# Altium schematic symbol library lib_datalogger.SchLib: 1246 symbols (part 10 of 16)
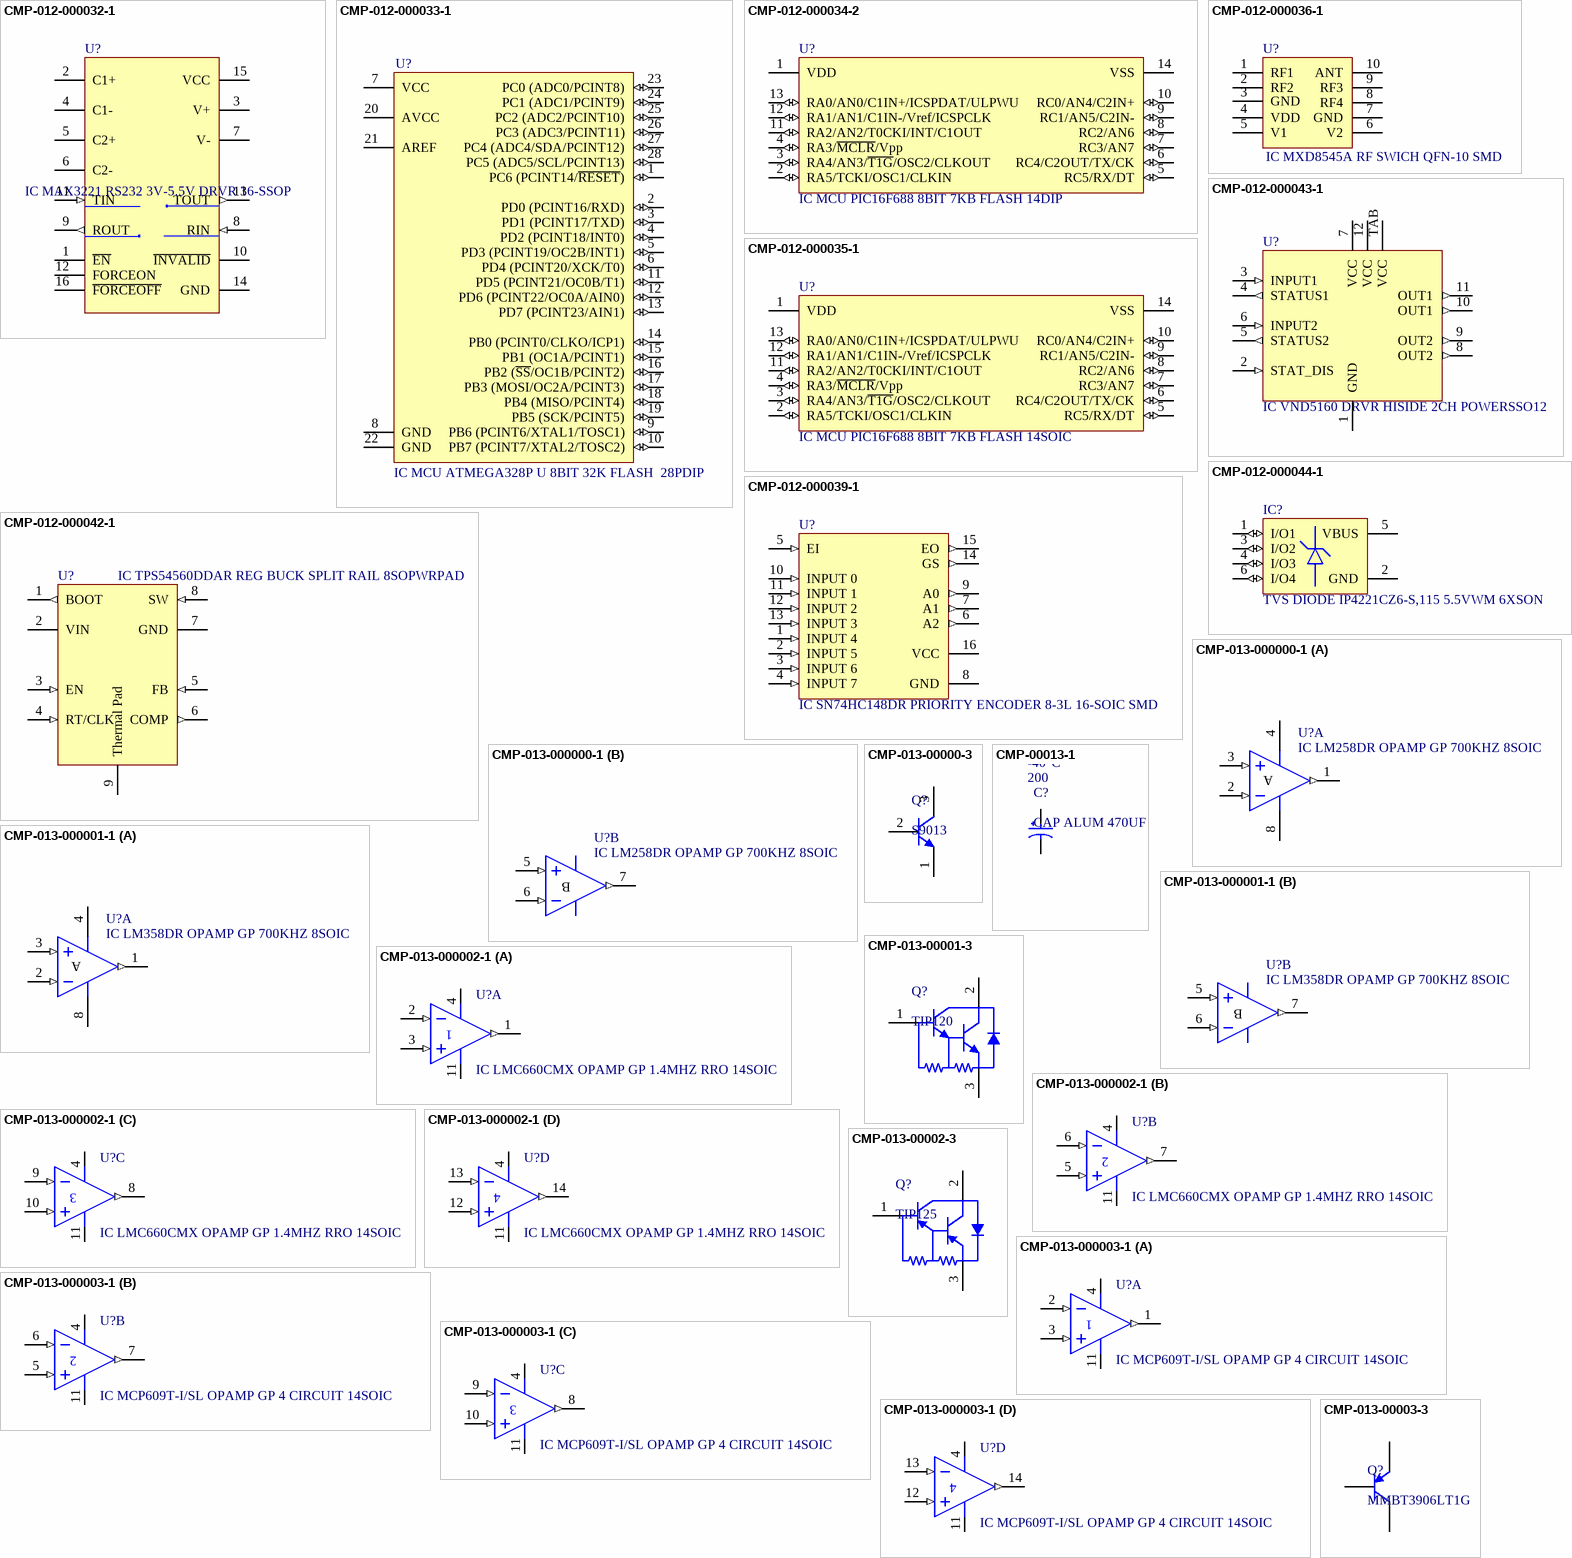
[diagram p52: symbols CMP-012-000032-1 to CMP-013-00003-3]

## CMP-012-000034-2
designator U?, comment IC MCU PIC16F688 8BIT 7KB FLASH 14DIP
IC MCU 8BIT 7KB FLASH 14DIP; Manufacturer Part Number: PIC16F688-I/P; Manufacturer: Microchip; Number of Bits: 8; Number of I2C Channels: 1; Max Frequency: 20MHz; Number of Programmable I/O: 12; Number of PWM Channels: 0; RAM Size: 256B; Address Bus Width: 8b; Number of Timers/Counters: 2; Access Time: 20us; Max Supply Voltage: 5.5V; Max Power Dissipation: 800mW; Min Supply Voltage: 2V; Peripherals: PWM,Brown-out Detect/Reset,POR,WDT; Core Architecture: PIC; Oscillator Type: Internal; Interface: UART,USART,SCI; Nominal Supply Current: 3.1mA; Watchdog Timer: Yes; Density: 7KB; ComponentLink1URL: https://datasheet.ciiva.com/16287/41203e-16287126.pdf?src-supplier=Future+Electronics; Stock 1: 533; Radiation Hardening: No; Lead Free: Lead Free; ComponentLink1Description: https://datasheet.ciiva.com/16287/41203e-16287126.pdf?src-supplier=Future+Electronics; REACH SVHC: No SVHC; Source: mits.SchLib; ComponentLink6URL: https://datasheet.ciiva.com/22671/1572921-22671231.pdf?src-supplier=Element14; Frequency: 20MHz; ComponentLink6Description: https://datasheet.ciiva.com/22671/1572921-22671231.pdf?src-supplier=Element14; Case/Package: PDIP; Memory Type: FLASH; Package Quantity: 30; ComponentLink4URL: https://datasheet.ciiva.com/7892/41203e-7892446.pdf?src-supplier=Element14; Min Operating Temperature: -40°C; Number of Pins: 14; Memory Size: 7KB; RoHS: Yes; Number of ADC Channels: 8; ComponentLink3Description: https://datasheet.ciiva.com/14132/asmicrochip-cont-pic16f6-en-14132075.pdf?src-supplier=Distrelec; Number of I/Os: 12; ComponentLink3URL: https://datasheet.ciiva.com/14132/asmicrochip-cont-pic16f6-en-14132075.pdf?src-supplier=Distrelec; Number of SPI Channels: 1; Design Item ID: IC MCU PIC16F688 8BIT 7KB FLASH 14DIP; ComponentLink5Description: https://datasheet.ciiva.com/22671/1572921-22671230.pdf?src-supplier=Element14; Packaging: Rail/Tube; Height: 0.195inch; Mount: Through Hole; Number of A/D Converters: 1; ComponentLink4Description: https://datasheet.ciiva.com/7892/41203e-7892446.pdf?src-supplier=Element14; Number of UART Channels: 1; ComponentLink2Description: https://datasheet.ciiva.com/1487/41203e-1487963.pdf?src-supplier=Digi-Key; Width: 0.28inch; ComponentLink2URL: https://datasheet.ciiva.com/1487/41203e-1487963.pdf?src-supplier=Digi-Key; Category: Microcontrollers; Max Operating Temperature: 85°C; Length: 19.69mm; Data Bus Width: 8b; ComponentLink5URL: https://datasheet.ciiva.com/22671/1572921-22671230.pdf?src-supplier=Element14; Pricing 1: 1=1,66000 (USD)
footprint 14-SOIC
footprint 14-PDIP (DIP; 16 Leads; Row Spacing 7.62 mm; Pitch 2.54 mm)
pins: 1 VDD (power) "Power Supply, 3.3V", 2 RA5/TCKI/OSC1/CLKIN (io), 3 RA4/AN3/~{T1G}/OSC2/CLKOUT (io), 4 RA3/~{MCLR}/Vpp (io), 5 RC5/RX/DT (io), 6 RC4/C2OUT/TX/CK (io), 7 RC3/AN7 (io), 8 RC2/AN6 (io), 9 RC1/AN5/C2IN- (io), 10 RC0/AN4/C2IN+ (io), 11 RA2/AN2/T0CKI/INT/C1OUT (io), 12 RA1/AN1/C1IN-/Vref/ICSPCLK (io), 13 RA0/AN0/C1IN+/ICSPDAT/ULPWU (io), 14 VSS (power) "GND"

## CMP-012-000035-1
designator U?, comment IC MCU PIC16F688 8BIT 7KB FLASH 14SOIC
8-bit Microcontrollers - MCU 7KB 256 RAM 12 I/O; Manufacturer: Microchip; Manufacturer Part Number: PIC16F688T-I/SL; Interface: UART,USART,SCI; Watchdog Timer: Yes; Number of I/Os: 12; Max Supply Voltage: 5.5V; Frequency: 20MHz; Number of ADC Channels: 8; Access Time: 20us; Nominal Supply Current: 220uA; Number of Timers/Counters: 2; Peripherals: Brown-out Detect/Reset,POR,WDT; Oscillator Type: Internal; Min Supply Voltage: 2V; RAM Size: 256B; Max Power Dissipation: 800mW; Core Architecture: PIC; Data Bus Width: 8b; ComponentLink6URL: https://datasheet.ciiva.com/22671/1572921-22671231.pdf?src-supplier=Element14; ComponentLink14Description: https://datasheet.ciiva.com/16396/41203e-16396367.pdf?src-supplier=Future+Electronics; ComponentLink6Description: https://datasheet.ciiva.com/22671/1572921-22671231.pdf?src-supplier=Element14; ComponentLink10URL: https://datasheet.ciiva.com/46382/1572921-46382664.pdf?src-supplier=Element14; ComponentLink9URL: https://datasheet.ciiva.com/9238/41203e-9238520.pdf?src-supplier=Avnet; Max Operating Temperature: 85°C; ComponentLink14URL: https://datasheet.ciiva.com/16396/41203e-16396367.pdf?src-supplier=Future+Electronics; Min Operating Temperature: -40°C; ComponentLink8URL: https://datasheet.ciiva.com/17384/41203e-17384135.pdf?src-supplier=Avnet+Europe; Memory Type: FLASH; ComponentLink11Description: https://datasheet.ciiva.com/6639/41203e-6639801.pdf?src-supplier=Digi-Key; Mount: Surface Mount; ComponentLink13Description: https://datasheet.ciiva.com/7892/1572921-7892447.pdf?src-supplier=Element14; Lead Free: Lead Free; Source: mits.SchLib; Design Item ID: IC MCU PIC16F688 8BIT 7KB FLASH 14SOIC; Memory Size: 7KB; ComponentLink1Description: https://datasheet.ciiva.com/16287/41203e-16287126.pdf?src-supplier=Future+Electronics; ComponentLink5Description: https://datasheet.ciiva.com/22671/1572921-22671230.pdf?src-supplier=Element14; Pricing 1: 1=1,61000 (USD); Number of Pins: 14; REACH SVHC: No SVHC; ComponentLink11URL: https://datasheet.ciiva.com/6639/41203e-6639801.pdf?src-supplier=Digi-Key; Packaging: Tape and Reel; Category: Microprocessors; RoHS: Yes; ComponentLink7Description: https://datasheet.ciiva.com/22671/1572921-22671232.pdf?src-supplier=Element14; ComponentLink4Description: https://datasheet.ciiva.com/7892/41203e-7892446.pdf?src-supplier=Element14; ComponentLink9Description: https://datasheet.ciiva.com/9238/41203e-9238520.pdf?src-supplier=Avnet; ComponentLink3URL: https://datasheet.ciiva.com/14132/asmicrochip-cont-pic16f6-en-14132075.pdf?src-supplier=Distrelec; ComponentLink12Description: https://datasheet.ciiva.com/14132/pic16f688-eng-tds-14132333.pdf?src-supplier=Distrelec; Max Frequency: 20MHz; Stock 1: 1701; ComponentLink1URL: https://datasheet.ciiva.com/16287/41203e-16287126.pdf?src-supplier=Future+Electronics; ComponentLink7URL: https://datasheet.ciiva.com/22671/1572921-22671232.pdf?src-supplier=Element14; ComponentLink13URL: https://datasheet.ciiva.com/7892/1572921-7892447.pdf?src-supplier=Element14; ComponentLink2Description: https://datasheet.ciiva.com/1487/41203e-1487963.pdf?src-supplier=Digi-Key; ComponentLink4URL: https://datasheet.ciiva.com/7892/41203e-7892446.pdf?src-supplier=Element14; Radiation Hardening: No; Case/Package: SOIC; Package Quantity: 2600; ComponentLink3Description: https://datasheet.ciiva.com/14132/asmicrochip-cont-pic16f6-en-14132075.pdf?src-supplier=Distrelec; Number of Programmable I/O: 12; Address Bus Width: 8b; ComponentLink12URL: https://datasheet.ciiva.com/14132/pic16f688-eng-tds-14132333.pdf?src-supplier=Distrelec; ComponentLink2URL: https://datasheet.ciiva.com/1487/41203e-1487963.pdf?src-supplier=Digi-Key; ComponentLink5URL: https://datasheet.ciiva.com/22671/1572921-22671230.pdf?src-supplier=Element14; ComponentLink8Description: https://datasheet.ciiva.com/17384/41203e-17384135.pdf?src-supplier=Avnet+Europe; ComponentLink10Description: https://datasheet.ciiva.com/46382/1572921-46382664.pdf?src-supplier=Element14
footprint 14-SOIC
footprint 14-SOIC
pins: 1 VDD (power) "Power Supply, 3.3V", 2 RA5/TCKI/OSC1/CLKIN (io), 3 RA4/AN3/~{T1G}/OSC2/CLKOUT (io), 4 RA3/~{MCLR}/Vpp (io), 5 RC5/RX/DT (io), 6 RC4/C2OUT/TX/CK (io), 7 RC3/AN7 (io), 8 RC2/AN6 (io), 9 RC1/AN5/C2IN- (io), 10 RC0/AN4/C2IN+ (io), 11 RA2/AN2/T0CKI/INT/C1OUT (io), 12 RA1/AN1/C1IN-/Vref/ICSPCLK (io), 13 RA0/AN0/C1IN+/ICSPDAT/ULPWU (io), 14 VSS (power) "GND"

## CMP-012-000036-1
designator U?, comment IC MXD8545A RF SWICH QFN-10 SMD
Manufacturer: Maxscend; Source: mits.SchLib; Supplier Unit Price 1: 0.2556; Design Item ID: IC MXD8545A RF SWICH QFN-10 SMD; ComponentLink1Description: Maxscend-MXD8545A_C285577.pdf; Manufacturer Part Number: MXD8545A; ComponentLink1URL: Maxscend-MXD8545A_C285577.pdf
footprint QFN-10
footprint QFN-10
pins: 1 RF1 "parallel data output", 2 RF2 "parallel data output", 3 GND (power) "parallel data output", 4 VDD (power) "parallel data output", 5 V1 "parallel data output", 6 V2 "parallel data output", 7 GND (power) "parallel data output", 8 RF4 (power) "ground (0 V)", 9 RF3 "serial data output", 10 ANT "master reset (active LOW)"

## CMP-012-000039-1
designator U?, comment IC SN74HC148DR PRIORITY ENCODER 8-3L 16-SOIC SMD
IC PRIORITY ENCODER 8-3L 16-SOIC; Manufacturer: Texas Instruments; Current - Output High, Low: 5.2mA, 5.2mA; Voltage Supply Source: Single Supply; Voltage - Supply: 2 V ~ 6 V; Circuit: 1 x 8:3; Pricing 1: 1=0.44, 10=0.353, 100=0.2406, 500=0.18046, 1000=0.13534 (USD); Part Status: Active; Category: Integrated Circuits (ICs); Type: Priority Encoder; Manufacturer Part Number: SN74HC148DR; Packaging: Cut Tape (CT); ComponentLink1URL: http://www.ti.com/lit/ds/symlink/sn74hc148.pdf; Operating Temperature: -40°C ~ 85°C; Design Item ID: IC SN74HC148DR PRIORITY ENCODER 8-3L 16-SOIC SMD; Stock 1: 4697; Mounting Type: Surface Mount; Source: mits.SchLib; Package / Case: 16-SOIC (0.154", 3.90mm Width); Supplier Device Package: 16-SOIC; RoHS: RoHS Compliant; ComponentLink1Description: http://www.ti.com/lit/ds/symlink/sn74hc148.pdf
footprint 16-SOIC(W)
footprint 16-SOIC(W)
pins: 1 INPUT 4 (in), 2 INPUT 5 (in), 3 INPUT 6 (in), 4 INPUT 7 (in), 5 EI (in), 6 A2 (out), 7 A1 (out), 8 GND (power), 9 A0 (out), 10 INPUT 0 (in), 11 INPUT 1 (in), 12 INPUT 2 (in), 13 INPUT 3 (in), 14 GS (out), 15 EO (out), 16 VCC (power)

## CMP-012-000042-1
designator U?, comment IC TPS54560DDAR REG BUCK SPLIT RAIL 8SOPWRPAD
IC REG BUCK SPLIT RAIL 8SOPWRPAD; Manufacturer: Texas Instruments; Frequency - Switching: 100kHz ~ 2.5MHz; Voltage - Output (Max): 58.8V; Current - Output: 5A; Voltage - Input (Max): 60V; Output Type: Adjustable; Synchronous Rectifier: No; Voltage - Output (Min/Fixed): 0.8V; Output Configuration: Positive; Function: Step-Down; Topology: Buck, Split Rail; Number of Outputs: 1; Voltage - Input (Min): 4.5V; Pricing 1: 1=5.65, 10=5.072, 100=4.1607, 500=3.5397, 1000=2.5875 (USD); Category: Integrated Circuits (ICs); Supplier Device Package: 8-SO PowerPad; Mounting Type: Surface Mount; Package / Case: 8-SOIC (0.154", 3.90mm Width) Exposed Pad; Design Item ID: IC TPS54560DDAR REG BUCK SPLIT RAIL 8SOPWRPAD; RoHS: RoHS Compliant; ComponentLink1URL: http://www.ti.com/lit/ds/symlink/tps54560.pdf; Source: mits.SchLib; Stock 1: 9096; Manufacturer Part Number: TPS54560DDAR; Packaging: Cut Tape (CT); ComponentLink1Description: http://www.ti.com/lit/ds/symlink/tps54560.pdf; Operating Temperature: -40°C ~ 150°C (TJ)
footprint HSOIC-8
footprint HSOIC-8
pins: 1 BOOT (out), 2 VIN (power), 3 EN (in), 4 RT/CLK (in), 5 FB (in), 6 COMP (out), 7 GND (power), 8 SW (in), 9 Thermal Pad (power)

## CMP-012-000043-1
designator U?, comment IC VND5160 DRVR HISIDE 2CH POWERSSO12
Part#: VND5160JTR-E; Manufacturer: STMicroelectronics; MSRP: 1,14581; eVendorPrice: 2,50; eVendor#: 497-11694-1-ND; eVendor: Digi-Key; MOQ: 1000; Source: mits.SchLib; Datasheet: http://www.st.com/web/en/resource/technical/document/datasheet/CD00153873.pdf; Design Item ID: IC VND5160 DRVR HISIDE 2CH POWERSSO12
footprint PowerSSO-12
footprint PowerSSO-12
pins: 1 GND (power), 2 STAT_DIS (in), 3 INPUT1 (in), 4 STATUS1 (out), 5 STATUS2 (out), 6 INPUT2 (in), 7 VCC (power), 8 OUT2 (out), 9 OUT2 (out), 10 OUT1 (out), 11 OUT1 (out), 12 VCC (power), TAB VCC (power)

## CMP-012-000044-1
designator IC?, comment TVS DIODE IP4221CZ6-S,115 5.5VWM 6XSON
TVS DIODE 5.5VWM 6XSON; Manufacturer: NXP Semiconductors; eVendorPrice: 0,55; MSRP: 0,13957; eVendor#: 568-6340-1-ND; eVendor: Digi-Key; Part#: IP4221CZ6-S,115; MOQ: 2500; Datasheet: http://www.nxp.com/documents/data_sheet/IP4221CZ6-S.pdf; Source: mits.SchLib; Design Item ID: TVS DIODE IP4221CZ6-S,115 5.5VWM 6XSON; Observações: -
footprint SOT886 (XSON6)
footprint SOT886 (XSON6)
pins: 1 I/O1 (io), 2 GND (power), 3 I/O2 (io), 4 I/O3 (io), 5 VBUS (power), 6 I/O4 (io)

## CMP-013-000000-1
designator U?, comment IC LM258DR OPAMP GP 700KHZ 8SOIC
IC OPAMP GP 700KHZ 8SOIC; Manufacturer: Texas Instruments; Number of Elements: 2; Operating Supply Current: 1mA; Output Current per Channel: 30mA; Common Mode Rejection Ratio: 70dB; Input Bias Current: 150nA; Max Supply Voltage: 32V; Max Dual Supply Voltage: 16V; Min Supply Voltage: 3V; Input Offset Voltage (Vos): 5mV; Min Dual Supply Voltage: 1.5V; Nominal Supply Current: 1.2mA; Dual Supply Voltage: 9V; Slew Rate: 0.3V/µs; Voltage Gain: 100dB; ComponentLink5URL: https://datasheet.ciiva.com/2973/lm358a-2973285.pdf?src-supplier=Avnet; ComponentLink8Description: https://datasheet.ciiva.com/48711/001071481-da-01-en-ic-opamp-gp-700khz-du-lm258dr-soic-8-tid-48711227.pdf?src-supplier=Conrad; Case/Package: SOIC; Width: 3.91mm; Radiation Hardening: No; Pricing 1: 1=0,43000, 10=0,32000, 25=0,28880, 100=0,15760, 250=0,15232, 500=0,13658, 1000=0,10506 (USD); Output Current: 30mA; Length: 4.9mm; Gain Bandwidth Product: 700kHz; ComponentLink6Description: https://datasheet.ciiva.com/26223/lm358a-26223035.pdf?src-supplier=Avnet+Europe; REACH SVHC: No SVHC; Number of Circuits: 2; ComponentLink3Description: https://datasheet.ciiva.com/1795/lm258a-1795506.pdf?src-supplier=Digi-Key; Number of Amplifiers: 2; Mount: Surface Mount; Lead Free: Lead Free; Category: Amplifiers - Op Amps, Buffer, Instrumentation; Source: mits.SchLib; Package Quantity: 1; Min Operating Temperature: -25°C; Packaging: Tape and Reel; RoHS: Yes; ComponentLink7Description: https://datasheet.ciiva.com/16464/lm358a-16464604.pdf?src-supplier=Avnet+Asia; Operating Supply Voltage: 16V; ComponentLink8URL: https://datasheet.ciiva.com/48711/001071481-da-01-en-ic-opamp-gp-700khz-du-lm258dr-soic-8-tid-48711227.pdf?src-supplier=Conrad; Height: 1.58mm; ComponentLink3URL: https://datasheet.ciiva.com/1795/lm258a-1795506.pdf?src-supplier=Digi-Key; Number of Channels: 2; ComponentLink4Description: https://datasheet.ciiva.com/1795/lm258a-1795507.pdf?src-supplier=Digi-Key; ComponentLink2URL: https://datasheet.ciiva.com/1795/lm258a-1795505.pdf?src-supplier=Digi-Key; Number of Pins: 8; ComponentLink1Description: https://datasheet.ciiva.com/34302/1342934-34302235.pdf?src-supplier=Jameco; ComponentLink1URL: https://datasheet.ciiva.com/34302/1342934-34302235.pdf?src-supplier=Jameco; Unity Gain Bandwidth Product: 700kHz; Stock 1: 29422; ComponentLink6URL: https://datasheet.ciiva.com/26223/lm358a-26223035.pdf?src-supplier=Avnet+Europe; ComponentLink7URL: https://datasheet.ciiva.com/16464/lm358a-16464604.pdf?src-supplier=Avnet+Asia; ComponentLink2Description: https://datasheet.ciiva.com/1795/lm258a-1795505.pdf?src-supplier=Digi-Key; ComponentLink4URL: https://datasheet.ciiva.com/1795/lm258a-1795507.pdf?src-supplier=Digi-Key; Design Item ID: IC LM258DR OPAMP GP 700KHZ 8SOIC; ComponentLink5Description: https://datasheet.ciiva.com/2973/lm358a-2973285.pdf?src-supplier=Avnet; Manufacturer Part Number: LM258DR; Bandwidth: 700kHz; Max Operating Temperature: 85°C
footprint SOIC-8
footprint SOIC-8
part A pins: 1 1OUT (out), 2 1IN- (in), 3 1IN+ (in), 4 GND (power), 8 VCC (power)
part B pins: 5 2IN+ (in), 6 2IN- (in), 7 2OUT (out)
part A text: A
part B text: B

## CMP-013-00000-3
designator Q?, comment S9013
Transistor, NPN, 0.1 uA, 150 MHz, 3-Pin TO-92; Manufacturer: Jiangsu Changjiang Electronics Technology; Case/Package: TO-92-3; Datasheet URL: http://www.cj-elec.com/txUpfile/20121910315050632.pdf; Datasheet Version: Rev. B, 11/2011; Package Description: 3-Pin Through Hole Device, Height 4.7 mm, Pitch 2.3 mm; Mounting Technology: TH; RoHS Compliant: False; Package Reference: TO-92-3
footprint JSCJ-TO-92-3_V (TO-92, 3-leads, Height 4.7mm, Pitch 1.27mm)
pins: 1 E, 2 B, 3 C

## CMP-00013-1
designator C?, comment CAP ALUM 470UF 20% 16V RADIAL  Package Quantity: 200  Min Operating Temperature: -40°C  Packaging: Bulk  Voltage Rating: 16V  Case/Package: Radial  Ripple Current: 440mA  Max Operating Temperature: 85°C  Capacitance: 470uF  Lead Pitch: 3.5mm  Tolerance: 20%  Diameter: 8mm
Capacitor; Aluminum Electrolytic; Cap 470uF; Vol-Rtg 16V; Radial; nHg; Lead Diameter: 0.6mm; Polarity: Polar; Life (Hours): 2000Hour; Lead/Base Style: Straight; Leakage Current: 3uA; Dissipation Factor: 0.2%; Construction: RADIAL; Radiation Hardening: No; Contact Plating: Tin; Mount: Through Hole,PCB; Series: M; REACH SVHC: No SVHC; Termination: Radial; Voltage: 16V; Height: 11.5mm; Length: 11.5mm; Number of Pins: 2; Height - Seated (Max): 0.492inch; Voltage Rating (DC): 16V
footprint CAP ALUM 470UF 20% 16V RADIAL-Footprint-1
pins: 1, 2

## CMP-013-000001-1
designator U?, comment IC LM358DR OPAMP GP 700KHZ 8SOIC
TEXAS INSTRUMENTS - LM358ADR - Operational Amplifier, 2 Amplifier, 700 kHz, 0.3 V/&#181;s, &#177; 1.5V to &#177; 16V, SOIC, 8 Pins; Number of Amplifiers: 2; Slew Rate: 0.3V/µs; Nominal Supply Current: 1.2mA; Max Supply Voltage: 32V; Dual Supply Voltage: 9V; Voltage Gain: 100dB; Common Mode Rejection Ratio: 65dB; Input Bias Current: 100nA; Output Current: 30mA; Min Supply Voltage: 3V; Operating Supply Current: 1mA; Input Offset Voltage (Vos): 3mV; Packaging: Tape and Reel; Gain Bandwidth Product: 700kHz; Height: 1.58mm; Min Operating Temperature: 0°C; RoHS: Yes; Category: Amplifiers - Op Amps, Buffer, Instrumentation; Manufacturer: Texas Instruments; ComponentLink4URL: https://datasheet.ciiva.com/2973/lm358a-2973371.pdf?src-supplier=Avnet; Manufacturer Part Number: LM358ADR; Case/Package: SOIC; REACH SVHC: No SVHC; ComponentLink3URL: https://datasheet.ciiva.com/1796/lm358-1796564.pdf?src-supplier=Digi-Key; Min Dual Supply Voltage: 1.5V; Length: 4.9mm; Mount: Surface Mount; Design Item ID: IC LM358DR OPAMP GP 700KHZ 8SOIC; Number of Elements: 2; Package Quantity: 2500; ComponentLink2Description: https://datasheet.ciiva.com/1796/lm358-1796563.pdf?src-supplier=Digi-Key; ComponentLink4Description: https://datasheet.ciiva.com/2973/lm358a-2973371.pdf?src-supplier=Avnet; Pricing 1: 1=0,30030, 10=0,25100, 30=0,24200, 100=0,23300, 500=0,22890, 1000=0,22690, 1=0,28910, 10=0,24160, 30=0,23290, 100=0,22420, 500=0,22030, 1000=0,21850, 1=1,50850, 10=1,26080, 30=1,21550, 100=1,17020, 500=1,14980, 1000=1,13990, 1=1,45020, 10=1,21210, 30=1,16850, 100=1,12490, 500=1,10530, 1000=1,09580, 1=0,19500, 10=0,16300, 30=0,15710, 100=0,15130, 500=0,14860, 1000=0,14740, 1=0,16670, 10=0,13930, 30=0,13430, 100=0,12930, 500=0,12710, 1000=0,12600, 1=1,78480, 10=1,49180, 30=1,43810, 100=1,38450, 500=1,36040, 1000=1,34870, 1=25,22510, 10=21,08320, 30=20,32510, 100=19,56700, 500=19,22650, 1000=19,06170, 1=0,95150, 10=0,79520, 30=0,76660, 100=0,73800, 500=0,72520, 1000=0,71900, 1=17,36940, 10=14,51730, 30=13,99530, 100=13,47340, 500=13,23880, 1000=13,12540, 1=1,99400, 10=1,66660, 30=1,60670, 100=1,54670, 500=1,51980, 1000=1,50680, 1=0,30950, 10=0,25870, 30=0,24940, 100=0,24010, 500=0,23590, 1000=0,23390, 1=0,22960, 10=0,19190, 30=0,18500, 100=0,17810, 500=0,17500, 1000=0,17350 (AUD); ComponentLink1URL: https://datasheet.ciiva.com/1796/lm358-1796562.pdf?src-supplier=Digi-Key; Source: mits.SchLib; Radiation Hardening: No; Number of Circuits: 2; Operating Supply Voltage: 16V; ComponentLink1Description: https://datasheet.ciiva.com/1796/lm358-1796562.pdf?src-supplier=Digi-Key; Unity Gain Bandwidth Product: 700kHz; ComponentLink2URL: https://datasheet.ciiva.com/1796/lm358-1796563.pdf?src-supplier=Digi-Key; Max Dual Supply Voltage: 16V; Number of Pins: 8; ComponentLink3Description: https://datasheet.ciiva.com/1796/lm358-1796564.pdf?src-supplier=Digi-Key; Lead Free: Lead Free; Width: 3.91mm; Output Current per Channel: 30mA; Stock 1: 136431; Max Operating Temperature: 70°C; Bandwidth: 700kHz; Number of Channels: 2
footprint SOIC-8
footprint SOIC-8
part A pins: 1 1OUT (out), 2 1IN- (in), 3 1IN+ (in), 4 GND (power), 8 VCC (power)
part B pins: 5 2IN+ (in), 6 2IN- (in), 7 2OUT (out)
part A text: A
part B text: B

## CMP-013-00001-3
designator Q?, comment TIP120
Plastic Medium-Power Complementary Silicon Transistor, 60 V VCEO, -65 to 150 degC, 3-Pin TO-220, RoHS, Tube; Manufacturer: ON Semiconductor; hFE Min: 1000; Package Version: Rev. AH, 08/2014; Vce Max: 4V; Package Quantity: 50; Pins: 3; Min Operating Temperature: -65°C; Datasheet Version: Rev. 9, 11/2014; Mounting Technology: TH; Package Description: 3-Pin Flange Mount, Vertical Straight Lead, Body 10.095 x 4.45 mm, Pitch 2.54 mm; Case/Package: TO-220-3; RoHS Compliant: True; Datasheet URL: http://www.onsemi.cn/pub_link/Collateral/TIP120-D.PDF; Packaging: Rail/Tube; Max Operating Temperature: 150°C; Package Reference: TO-220-3-221A-09
footprint ONSC-TO-220-3-221A-09 (FM, 3-Leads, Body 10.55x4.85mm, Pitch 2.54mm)
pins: 1 B, 2 C, 3 E

## CMP-013-000002-1
designator U?, comment IC LMC660CMX OPAMP GP 1.4MHZ RRO 14SOIC
IC OPAMP GP 1.4MHZ RRO 14SOIC; Manufacturer: Texas Instruments; Manufacturer Part Number: LMC660CMX/NOPB; Current - Supply: 1.5mA; Output Type: Rail-to-Rail; Current - Output / Channel: 40mA; Voltage - Input Offset: 1mV; Amplifier Type: General Purpose; Voltage - Supply, Single/Dual (±): 4.75 V ~ 15.5 V, ±2.38 V ~ 7.75 V; Slew Rate: 1.1 V/µs; Number of Circuits: 4; Current - Input Bias: 0.002pA; -3db Bandwidth: -; Source: mits.SchLib; RoHS: RoHS Compliant; Package / Case: 14-SOIC (0.154", 3.90mm Width); ComponentLink1Description: http://www.ti.com/lit/ds/symlink/lmc660.pdf; Packaging: Cut Tape (CT); ComponentLink1URL: http://www.ti.com/lit/ds/symlink/lmc660.pdf; Operating Temperature: 0°C ~ 70°C; Design Item ID: IC LMC660CMX OPAMP GP 1.4MHZ RRO 14SOIC; Supplier Device Package: 14-SOICN; Stock 1: 1796; Mounting Type: Surface Mount; Gain Bandwidth Product: 1.4MHz; Pricing 1: 1=2.03, 10=1.824, 100=1.4629, 500=1.2024, 1000=0.835 (USD); Category: Integrated Circuits (ICs)
footprint 14-SOIC
footprint 14-SOIC
part A pins: 1 1OUT (out), 2 1IN- (in), 3 1IN+ (in), 4 V+ (power), 11 V- (power)
part B pins: 4 V+ (power), 5 2IN+ (in), 6 2IN- (in), 7 2OUT (out), 11 V- (power)
part C pins: 4 V+ (power), 8 3OUT (out), 9 3IN- (in), 10 3IN+ (in), 11 V- (power)
part D pins: 4 V+ (power), 11 V- (power), 12 4IN+ (in), 13 4IN- (in), 14 4OUT (out)

## CMP-013-00002-3
designator Q?, comment TIP125
Plastic Medium-Power Complementary Silicon Transistor, 60 V VCEO, -65 to 150 degC, 3-Pin TO-220, RoHS, Tube; Manufacturer: ON Semiconductor; hFE Min: 1000; Package Version: Rev. AH, 08/2014; Vce Max: 4V; Package Quantity: 50; Mounting Technology: TH; Pins: 3; Min Operating Temperature: -65°C; Case/Package: TO-220-3; Package Description: 3-Pin Flange Mount, Vertical Straight Lead, Body 10.095 x 4.45 mm, Pitch 2.54 mm; Packaging: Rail/Tube; Package Reference: TO-220-3-221A-09; Max Operating Temperature: 150°C; RoHS Compliant: True; Datasheet URL: http://www.onsemi.cn/pub_link/Collateral/TIP120-D.PDF; Datasheet Version: Rev. 9, 11/2014
footprint ONSC-TO-220-3-221A-09 (FM, 3-Leads, Body 10.55x4.85mm, Pitch 2.54mm)
pins: 1 B, 2 C, 3 E

## CMP-013-000003-1
designator U?, comment IC MCP609T-I/SL OPAMP GP 4 CIRCUIT 14SOIC
IC OP-AMP MCP609T-I/SL SOIC-14 Amplifier; Manufacturer Part Number: LMC660CMX/NOPB; Manufacturer: Texas Instruments; Current - Output / Channel: 40mA; Voltage - Input Offset: 1mV; Number of Channels: 4; Input Bias Current: 1pA; Unity Gain Bandwidth Product: 155kHz; Gain Bandwidth Product: 1.4MHz; Output Current: 17mA; Min Supply Voltage: 2.5V; Input Offset Voltage (Vos): 250uV; Voltage Gain: 121dB; Power Supply Rejection Ratio (PSRR): 80dB; Common Mode Rejection Ratio: 75dB; Operating Supply Current: 18.7uA; Voltage - Supply, Single/Dual (±): 4.75 V ~ 15.5 V, ±2.38 V ~ 7.75 V; Amplifier Type: General Purpose; Output Type: Rail-to-Rail; Current - Input Bias: 0.002pA; Current - Supply: 1.5mA; Slew Rate: 1.1 V/µs; Nominal Supply Current: 25uA; Operating Supply Voltage: 5.5V; Max Supply Voltage: 6V; -3db Bandwidth: -; ComponentLink3URL: https://datasheet.ciiva.com/1805/11177f-1805482.pdf?src-supplier=Digi-Key; ComponentLink4URL: https://datasheet.ciiva.com/16450/filehandler-aspxddocname-en011259-16450555.pdf?src-supplier=Future+Electronics; Source: mits.SchLib; Package Quantity: 2600; Case/Package: SOIC; ComponentLink4Description: https://datasheet.ciiva.com/16450/filehandler-aspxddocname-en011259-16450555.pdf?src-supplier=Future+Electronics; Operating Temperature: 0°C ~ 70°C; Category: Integrated Circuits (ICs); Mount: Surface Mount; ComponentLink2Description: https://datasheet.ciiva.com/17573/11177f-17573110.pdf?src-supplier=Avnet+Europe; Packaging: Cut Tape (CT); Bandwidth: 155kHz; RoHS: RoHS Compliant; ComponentLink1Description: http://www.ti.com/lit/ds/symlink/lmc660.pdf; Number of Circuits: 4; Radiation Hardening: No; Stock 1: 3734; Lead Free: Lead Free; ComponentLink3Description: https://datasheet.ciiva.com/1805/11177f-1805482.pdf?src-supplier=Digi-Key; Mounting Type: Surface Mount; ComponentLink2URL: https://datasheet.ciiva.com/17573/11177f-17573110.pdf?src-supplier=Avnet+Europe; Contact Plating: Tin,Matte; Number of Pins: 14; Package / Case: 14-SOIC (0.154", 3.90mm Width); Min Operating Temperature: -40°C; Output Current per Channel: 17mA; Design Item ID: IC MCP609T-I/SL OPAMP GP 4 CIRCUIT 14SOIC; Supplier Device Package: 14-SOICN; ComponentLink1URL: http://www.ti.com/lit/ds/symlink/lmc660.pdf; Number of Elements: 4; Pricing 1: 1=1,46000, 25=1,21000, 100=1,10000 (USD); Max Operating Temperature: 85°C
footprint 14-SOIC
footprint 14-SOIC
part A pins: 1 1OUT (out), 2 1IN- (in), 3 1IN+ (in), 4 V+ (power), 11 V- (power)
part B pins: 4 V+ (power), 5 2IN+ (in), 6 2IN- (in), 7 2OUT (out), 11 V- (power)
part C pins: 4 V+ (power), 8 3OUT (out), 9 3IN- (in), 10 3IN+ (in), 11 V- (power)
part D pins: 4 V+ (power), 11 V- (power), 12 4IN+ (in), 13 4IN- (in), 14 4OUT (out)

## CMP-013-00003-3
designator Q?, comment MMBT3906LT1G